# Altium footprint library Connectors_THT.PcbLib: 103 footprints (part 6 of 11)
Each footprint in its own frame and in the unit in brackets; x right, y up, seen from the top. Pads: shape width x height; smd on the part's side, far side on the other; paste and mask are expansions set on the pad; w line width, h text height; cw(c..) or ccw(c..) is an arc to the next point about the centre after c.
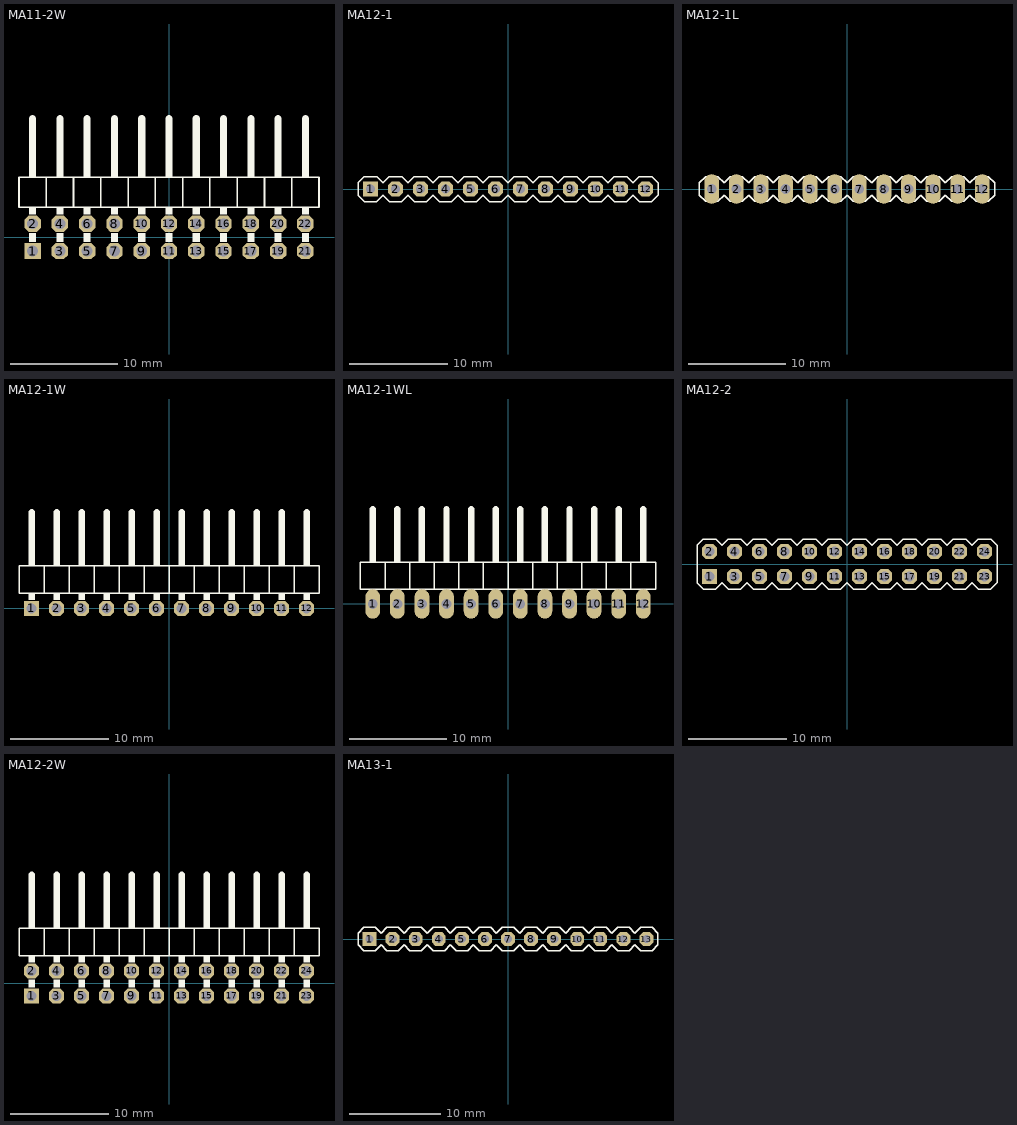
[diagram p5: the footprints below, top view; thin cyan lines are the x and y axes]

## MA11-2W [mil]
pads (22):
  rect 60x60 hole 40: 1(-500,-50)
  oct 60x60 hole 40: 2(-500,50) 3(-400,-50) 4(-400,50) 5(-300,-50) 6(-300,50) 7(-200,-50) 8(-200,50) 9(-100,-50) 10(-100,50) 11(0,-50) 12(0,50) 13(100,-50) 14(100,50) 15(200,-50) 16(200,50) 17(300,-50) 18(300,50) 19(400,-50) 20(400,50) 21(500,-50) 22(500,50)
Top Overlay:
  rectangle: 487,-16 513,16
  rectangle: 387,-16 413,16
  rectangle: 287,-16 313,16
  rectangle: 187,-16 213,16
  rectangle: 87,-16 113,16
  rectangle: -13,-16 13,16
  rectangle: -113,-16 -87,16
  rectangle: -213,-16 -187,16
  rectangle: -313,-16 -287,16
  rectangle: -413,-16 -387,16
  rectangle: -513,-16 -487,16
  rectangle: -513,84 -487,110
  rectangle: -413,84 -387,110
  rectangle: -313,84 -287,110
  rectangle: -213,84 -187,110
  rectangle: -113,84 -87,110
  rectangle: -13,84 13,110
  rectangle: 87,84 113,110
  rectangle: 187,84 213,110
  rectangle: 287,84 313,110
  rectangle: 387,84 413,110
  rectangle: 487,84 513,110
  rectangle: -113,220 -87,250
  rectangle: -213,220 -187,250
  rectangle: -313,220 -287,250
  rectangle: -413,220 -387,250
  rectangle: -513,220 -487,250
  rectangle: 387,220 413,250
  rectangle: 287,220 313,250
  rectangle: 187,220 213,250
  rectangle: 87,220 113,250
  rectangle: -13,220 13,250
  rectangle: 487,220 513,250
  lines w6: -450,110 -350,110 ; -450,110 -550,110 -550,220 -450,220 ; -450,110 -450,220 ; -450,220 -350,220 ; -350,110 -350,220 ; -350,110 -250,110 ; -350,220 -250,220 ; -250,110 -250,220 ; -250,110 -150,110 ; -250,220 -150,220 ; -150,110 -150,220 ; -150,110 -50,110 ; -150,220 -50,220 ; -50,110 -50,220 ; -50,110 50,110 ; -50,220 50,220 ; 50,110 150,110 ; 50,110 50,220 ; 50,220 150,220 ; 150,110 150,220 ; 150,110 250,110 ; 150,220 250,220 ; 250,110 250,220 ; 250,110 350,110 ; 250,220 350,220 ; 350,110 350,220 ; 350,110 450,110 ; 350,220 450,220 ; 450,110 450,220 ; 450,110 550,110 550,220 450,220
  lines w26: -500,250 -500,435 ; -400,250 -400,435 ; -300,250 -300,435 ; -200,250 -200,435 ; -100,250 -100,435 ; 0,250 0,435 ; 100,250 100,435 ; 200,250 200,435 ; 300,250 300,435 ; 400,250 400,435 ; 500,250 500,435
3D body: height 31.5, standoff 0, extent -112.49,-62.49 -87.49,-37.49
3D body: height 31.5, standoff 0, extent -112.49,37.51 -87.49,62.51
3D body: height 31.5, standoff 0, extent -212.49,-62.49 -187.49,-37.49
3D body: height 31.5, standoff 0, extent -212.49,37.51 -187.49,62.51
3D body: height 31.5, standoff 0, extent -312.49,37.51 -287.49,62.51
3D body: height 31.5, standoff 0, extent -312.49,-62.49 -287.49,-37.49
3D body: height 31.5, standoff 0, extent -412.49,-62.49 -387.49,-37.49
3D body: height 31.5, standoff 0, extent -412.49,37.51 -387.49,62.51
3D body: height 31.5, standoff 0, extent -512.5,-62.5 -487.5,-37.5
3D body: height 31.5, standoff 0, extent -512.49,37.5 -487.49,62.5
3D body: height 162.48, standoff 137.52, extent -512.5,-62.5 -487.5,443.75
3D body: height 162.48, standoff 0, extent -512.5,-62.5 -487.5,-37.5
3D body: height 62.48, standoff 0, extent -512.49,37.51 -487.49,62.51
3D body: height 200, standoff 0, extent -550,110 -450,220
3D body: height 62.5, standoff 37.5, extent -512.5,37.51 -487.5,443.75
3D body: height 62.5, standoff 37.5, extent -412.49,37.51 -387.49,443.76
3D body: height 200, standoff 0, extent -450,110 -350,220
3D body: height 62.48, standoff 0, extent -412.49,37.51 -387.49,62.51
3D body: height 162.48, standoff 0, extent -412.49,-62.49 -387.49,-37.49
3D body: height 162.48, standoff 137.52, extent -412.5,-62.49 -387.5,443.76
3D body: height 62.5, standoff 37.5, extent -312.49,37.51 -287.49,443.76
3D body: height 200, standoff 0, extent -350,110 -250,220
3D body: height 62.48, standoff 0, extent -312.49,37.51 -287.49,62.51
3D body: height 162.48, standoff 0, extent -312.49,-62.49 -287.49,-37.49
3D body: height 162.48, standoff 137.52, extent -312.5,-62.49 -287.5,443.76
3D body: height 62.5, standoff 37.5, extent -212.49,37.51 -187.49,443.76
3D body: height 200, standoff 0, extent -250,110 -150,220
3D body: height 62.48, standoff 0, extent -212.49,37.51 -187.49,62.51
3D body: height 162.48, standoff 0, extent -212.49,-62.49 -187.49,-37.49
3D body: height 162.48, standoff 137.52, extent -212.5,-62.49 -187.5,443.76
3D body: height 62.5, standoff 37.5, extent -112.49,37.51 -87.49,443.76
3D body: height 200, standoff 0, extent -150,110 -50,220
3D body: height 62.48, standoff 0, extent -112.49,37.51 -87.49,62.51
3D body: height 162.48, standoff 0, extent -112.49,-62.49 -87.49,-37.49
3D body: height 162.48, standoff 137.52, extent -112.5,-62.49 -87.5,443.76
3D body: height 31.5, standoff 0, extent 387.51,-62.49 412.51,-37.49
3D body: height 31.5, standoff 0, extent 387.51,37.51 412.51,62.51
3D body: height 31.5, standoff 0, extent 287.51,-62.49 312.51,-37.49
3D body: height 31.5, standoff 0, extent 287.51,37.51 312.51,62.51
3D body: height 31.5, standoff 0, extent 187.51,37.51 212.51,62.51
3D body: height 31.5, standoff 0, extent 187.51,-62.49 212.51,-37.49
3D body: height 31.5, standoff 0, extent 87.51,-62.49 112.51,-37.49
3D body: height 31.5, standoff 0, extent 87.51,37.51 112.51,62.51
3D body: height 31.5, standoff 0, extent -12.5,-62.5 12.5,-37.5
3D body: height 31.5, standoff 0, extent -12.49,37.5 12.51,62.5
3D body: height 162.48, standoff 137.52, extent -12.5,-62.5 12.5,443.75
3D body: height 162.48, standoff 0, extent -12.5,-62.5 12.5,-37.5
3D body: height 62.48, standoff 0, extent -12.49,37.51 12.51,62.51
3D body: height 200, standoff 0, extent -50,110 50,220
3D body: height 62.5, standoff 37.5, extent -12.5,37.51 12.5,443.75
3D body: height 62.5, standoff 37.5, extent 87.51,37.51 112.51,443.76
3D body: height 200, standoff 0, extent 50,110 150,220
3D body: height 62.48, standoff 0, extent 87.51,37.51 112.51,62.51
3D body: height 162.48, standoff 0, extent 87.51,-62.49 112.51,-37.49
3D body: height 162.48, standoff 137.52, extent 87.5,-62.49 112.5,443.76
3D body: height 62.5, standoff 37.5, extent 187.51,37.51 212.51,443.76
3D body: height 200, standoff 0, extent 150,110 250,220
3D body: height 62.48, standoff 0, extent 187.51,37.51 212.51,62.51
3D body: height 162.48, standoff 0, extent 187.51,-62.49 212.51,-37.49
3D body: height 162.48, standoff 137.52, extent 187.5,-62.49 212.5,443.76
3D body: height 62.5, standoff 37.5, extent 287.51,37.51 312.51,443.76
3D body: height 200, standoff 0, extent 250,110 350,220
3D body: height 62.48, standoff 0, extent 287.51,37.51 312.51,62.51
3D body: height 162.48, standoff 0, extent 287.51,-62.49 312.51,-37.49
3D body: height 162.48, standoff 137.52, extent 287.5,-62.49 312.5,443.76
3D body: height 62.5, standoff 37.5, extent 387.51,37.51 412.51,443.76
3D body: height 200, standoff 0, extent 350,110 450,220
3D body: height 62.48, standoff 0, extent 387.51,37.51 412.51,62.51
3D body: height 162.48, standoff 0, extent 387.51,-62.49 412.51,-37.49
3D body: height 162.48, standoff 137.52, extent 387.5,-62.49 412.5,443.76
3D body: height 31.5, standoff 0, extent 487.5,-62.5 512.5,-37.5
3D body: height 31.5, standoff 0, extent 487.51,37.5 512.51,62.5
3D body: height 162.48, standoff 137.52, extent 487.5,-62.5 512.5,443.75
3D body: height 162.48, standoff 0, extent 487.5,-62.5 512.5,-37.5
3D body: height 62.48, standoff 0, extent 487.51,37.51 512.51,62.51
3D body: height 200, standoff 0, extent 450,110 550,220
3D body: height 62.5, standoff 37.5, extent 487.5,37.51 512.5,443.75

## MA12-1 [mil]
pads (12):
  rect 60x60 hole 36: 1(-550,0)
  oct 60x60 hole 36: 2(-450,0) 3(-350,0) 4(-250,0) 5(-150,0) 6(-50,0) 7(50,0) 8(150,0) 9(250,0) 10(350,0) 11(450,0) 12(550,0)
Top Overlay:
  lines w6: -600,-25 -575,-50 -525,-50 -500,-25 -475,-50 -425,-50 -400,-25 -375,-50 -325,-50 -300,-25 -275,-50 -225,-50 -200,-25 -175,-50 -125,-50 -100,-25 -75,-50 -25,-50 0,-25 25,-50 75,-50 100,-25 125,-50 175,-50 200,-25 225,-50 275,-50 300,-25 325,-50 375,-50 400,-25 425,-50 475,-50 500,-25 525,-50 575,-50 600,-25 600,25 575,50 525,50 500,25 475,50 425,50 400,25 375,50 325,50 300,25 275,50 225,50 200,25 175,50 125,50 100,25 75,50 25,50 0,25 -25,50 -75,50 -100,25 -125,50 -175,50 -200,25 -225,50 -275,50 -300,25 -325,50 -375,50 -400,25 -425,50 -475,50 -500,25 -525,50 -575,50 -600,25 -600,-25
3D body: height 338.58, standoff 0, extent 537.5,-12.5 562.5,12.5
3D body: height 98.43, standoff 11.81, extent 500,-50 600,50
3D body: height 11.81, standoff 0, extent 500,-50 600,-25
3D body: height 11.81, standoff 0, extent 500,25 600,50
3D body: height 31.5, standoff 0, extent 537.5,-12.5 562.5,12.5
3D body: height 338.58, standoff 0, extent 437.5,-12.5 462.5,12.5
3D body: height 98.43, standoff 11.81, extent 400,-50 500,50
3D body: height 11.81, standoff 0, extent 400,-50 500,-25
3D body: height 11.81, standoff 0, extent 400,25 500,50
3D body: height 31.5, standoff 0, extent 437.5,-12.5 462.5,12.5
3D body: height 338.58, standoff 0, extent 337.5,-12.5 362.5,12.5
3D body: height 98.43, standoff 11.81, extent 300,-50 400,50
3D body: height 11.81, standoff 0, extent 300,-50 400,-25
3D body: height 11.81, standoff 0, extent 300,25 400,50
3D body: height 31.5, standoff 0, extent 337.5,-12.5 362.5,12.5
3D body: height 338.58, standoff 0, extent 237.5,-12.5 262.5,12.5
3D body: height 98.43, standoff 11.81, extent 200,-50 300,50
3D body: height 11.81, standoff 0, extent 200,-50 300,-25
3D body: height 11.81, standoff 0, extent 200,25 300,50
3D body: height 31.5, standoff 0, extent 237.5,-12.5 262.5,12.5
3D body: height 338.58, standoff 0, extent 137.5,-12.5 162.5,12.5
3D body: height 98.43, standoff 11.81, extent 100,-50 200,50
3D body: height 11.81, standoff 0, extent 100,-50 200,-25
3D body: height 11.81, standoff 0, extent 100,25 200,50
3D body: height 31.5, standoff 0, extent 137.5,-12.5 162.5,12.5
3D body: height 338.58, standoff 0, extent 37.5,-12.5 62.5,12.5
3D body: height 98.43, standoff 11.81, extent 0,-50 100,50
3D body: height 11.81, standoff 0, extent 0,-50 100,-25
3D body: height 11.81, standoff 0, extent 0,25 100,50
3D body: height 31.5, standoff 0, extent 37.5,-12.5 62.5,12.5
3D body: height 338.58, standoff 0, extent -62.5,-12.5 -37.5,12.5
3D body: height 98.43, standoff 11.81, extent -100,-50 0,50
3D body: height 11.81, standoff 0, extent -100,-50 0,-25
3D body: height 11.81, standoff 0, extent -100,25 0,50
3D body: height 31.5, standoff 0, extent -62.5,-12.5 -37.5,12.5
3D body: height 338.58, standoff 0, extent -162.5,-12.5 -137.5,12.5
3D body: height 98.43, standoff 11.81, extent -200,-50 -100,50
3D body: height 11.81, standoff 0, extent -200,-50 -100,-25
3D body: height 11.81, standoff 0, extent -200,25 -100,50
3D body: height 31.5, standoff 0, extent -162.5,-12.5 -137.5,12.5
3D body: height 338.58, standoff 0, extent -262.5,-12.5 -237.5,12.5
3D body: height 98.43, standoff 11.81, extent -300,-50 -200,50
3D body: height 11.81, standoff 0, extent -300,-50 -200,-25
3D body: height 11.81, standoff 0, extent -300,25 -200,50
3D body: height 31.5, standoff 0, extent -262.5,-12.5 -237.5,12.5
3D body: height 338.58, standoff 0, extent -362.5,-12.5 -337.5,12.5
3D body: height 98.43, standoff 11.81, extent -400,-50 -300,50
3D body: height 11.81, standoff 0, extent -400,-50 -300,-25
3D body: height 11.81, standoff 0, extent -400,25 -300,50
3D body: height 31.5, standoff 0, extent -362.5,-12.5 -337.5,12.5
3D body: height 338.58, standoff 0, extent -462.5,-12.5 -437.5,12.5
3D body: height 98.43, standoff 11.81, extent -500,-50 -400,50
3D body: height 11.81, standoff 0, extent -500,-50 -400,-25
3D body: height 11.81, standoff 0, extent -500,25 -400,50
3D body: height 31.5, standoff 0, extent -462.5,-12.5 -437.5,12.5
3D body: height 338.58, standoff 0, extent -562.5,-12.5 -537.5,12.5
3D body: height 98.43, standoff 11.81, extent -600,-50 -500,50
3D body: height 11.81, standoff 0, extent -600,-50 -500,-25
3D body: height 11.81, standoff 0, extent -600,25 -500,50
3D body: height 31.5, standoff 0, extent -562.5,-12.5 -537.5,12.5

## MA12-1L [mil]
pads (12):
  oval 60x120 hole 40: 1(-550,0) 2(-450,0) 3(-350,0) 4(-250,0) 5(-150,0) 6(-50,0) 7(50,0) 8(150,0) 9(250,0) 10(350,0) 11(450,0) 12(550,0)
Top Overlay:
  lines w6: -600,-25 -575,-50 -525,-50 -500,-25 -475,-50 -425,-50 -400,-25 -375,-50 -325,-50 -300,-25 -275,-50 -225,-50 -200,-25 -175,-50 -125,-50 -100,-25 -75,-50 -25,-50 0,-25 25,-50 75,-50 100,-25 125,-50 175,-50 200,-25 225,-50 275,-50 300,-25 325,-50 375,-50 400,-25 425,-50 475,-50 500,-25 525,-50 575,-50 600,-25 600,25 575,50 525,50 500,25 475,50 425,50 400,25 375,50 325,50 300,25 275,50 225,50 200,25 175,50 125,50 100,25 75,50 25,50 0,25 -25,50 -75,50 -100,25 -125,50 -175,50 -200,25 -225,50 -275,50 -300,25 -325,50 -375,50 -400,25 -425,50 -475,50 -500,25 -525,50 -575,50 -600,25 -600,-25
3D body: height 31.5, standoff 0, extent -562.5,-12.5 -537.5,12.5
3D body: height 11.81, standoff 0, extent -600,25 -500,50
3D body: height 11.81, standoff 0, extent -600,-50 -500,-25
3D body: height 98.43, standoff 11.81, extent -600,-50 -500,50
3D body: height 338.58, standoff 0, extent -562.49,-12.49 -537.49,12.51
3D body: height 31.5, standoff 0, extent -462.5,-12.5 -437.5,12.5
3D body: height 11.81, standoff 0, extent -500,25 -400,50
3D body: height 11.81, standoff 0, extent -500,-50 -400,-25
3D body: height 98.43, standoff 11.81, extent -500,-50 -400,50
3D body: height 338.58, standoff 0, extent -462.49,-12.49 -437.49,12.51
3D body: height 31.5, standoff 0, extent -362.5,-12.5 -337.5,12.5
3D body: height 11.81, standoff 0, extent -400,25 -300,50
3D body: height 11.81, standoff 0, extent -400,-50 -300,-25
3D body: height 98.43, standoff 11.81, extent -400,-50 -300,50
3D body: height 338.58, standoff 0, extent -362.49,-12.49 -337.49,12.51
3D body: height 31.5, standoff 0, extent -262.5,-12.5 -237.5,12.5
3D body: height 11.81, standoff 0, extent -300,25 -200,50
3D body: height 11.81, standoff 0, extent -300,-50 -200,-25
3D body: height 98.43, standoff 11.81, extent -300,-50 -200,50
3D body: height 338.58, standoff 0, extent -262.49,-12.49 -237.49,12.51
3D body: height 31.5, standoff 0, extent -162.5,-12.5 -137.5,12.5
3D body: height 11.81, standoff 0, extent -200,25 -100,50
3D body: height 11.81, standoff 0, extent -200,-50 -100,-25
3D body: height 98.43, standoff 11.81, extent -200,-50 -100,50
3D body: height 338.58, standoff 0, extent -162.49,-12.49 -137.49,12.51
3D body: height 31.5, standoff 0, extent -62.5,-12.5 -37.5,12.5
3D body: height 11.81, standoff 0, extent -100,25 0,50
3D body: height 11.81, standoff 0, extent -100,-50 0,-25
3D body: height 98.43, standoff 11.81, extent -100,-50 0,50
3D body: height 338.58, standoff 0, extent -62.49,-12.49 -37.49,12.51
3D body: height 31.5, standoff 0, extent 37.5,-12.5 62.5,12.5
3D body: height 11.81, standoff 0, extent 0,25 100,50
3D body: height 11.81, standoff 0, extent 0,-50 100,-25
3D body: height 98.43, standoff 11.81, extent 0,-50 100,50
3D body: height 338.58, standoff 0, extent 37.51,-12.49 62.51,12.51
3D body: height 31.5, standoff 0, extent 137.5,-12.5 162.5,12.5
3D body: height 11.81, standoff 0, extent 100,25 200,50
3D body: height 11.81, standoff 0, extent 100,-50 200,-25
3D body: height 98.43, standoff 11.81, extent 100,-50 200,50
3D body: height 338.58, standoff 0, extent 137.51,-12.49 162.51,12.51
3D body: height 31.5, standoff 0, extent 237.5,-12.5 262.5,12.5
3D body: height 11.81, standoff 0, extent 200,25 300,50
3D body: height 11.81, standoff 0, extent 200,-50 300,-25
3D body: height 98.43, standoff 11.81, extent 200,-50 300,50
3D body: height 338.58, standoff 0, extent 237.51,-12.49 262.51,12.51
3D body: height 31.5, standoff 0, extent 337.5,-12.5 362.5,12.5
3D body: height 11.81, standoff 0, extent 300,25 400,50
3D body: height 11.81, standoff 0, extent 300,-50 400,-25
3D body: height 98.43, standoff 11.81, extent 300,-50 400,50
3D body: height 338.58, standoff 0, extent 337.51,-12.49 362.51,12.51
3D body: height 31.5, standoff 0, extent 437.5,-12.5 462.5,12.5
3D body: height 11.81, standoff 0, extent 400,25 500,50
3D body: height 11.81, standoff 0, extent 400,-50 500,-25
3D body: height 98.43, standoff 11.81, extent 400,-50 500,50
3D body: height 338.58, standoff 0, extent 437.51,-12.49 462.51,12.51
3D body: height 31.5, standoff 0, extent 537.5,-12.5 562.5,12.5
3D body: height 11.81, standoff 0, extent 500,25 600,50
3D body: height 11.81, standoff 0, extent 500,-50 600,-25
3D body: height 98.43, standoff 11.81, extent 500,-50 600,50
3D body: height 338.58, standoff 0, extent 537.51,-12.49 562.51,12.51

## MA12-1W [mil]
pads (12):
  rect 60x60 hole 40: 1(-550,0)
  oct 60x60 hole 40: 2(-450,0) 3(-350,0) 4(-250,0) 5(-150,0) 6(-50,0) 7(50,0) 8(150,0) 9(250,0) 10(350,0) 11(450,0) 12(550,0)
Top Overlay:
  rectangle: 437,170 463,200
  rectangle: 537,170 563,200
  rectangle: -63,170 -37,200
  rectangle: 37,170 63,200
  rectangle: 137,170 163,200
  rectangle: 237,170 263,200
  rectangle: 337,170 363,200
  rectangle: -563,170 -537,200
  rectangle: -463,170 -437,200
  rectangle: -363,170 -337,200
  rectangle: -263,170 -237,200
  rectangle: -163,170 -137,200
  rectangle: 537,34 563,60
  rectangle: 437,34 463,60
  rectangle: 337,34 363,60
  rectangle: 237,34 263,60
  rectangle: 137,34 163,60
  rectangle: 37,34 63,60
  rectangle: -63,34 -37,60
  rectangle: -163,34 -137,60
  rectangle: -263,34 -237,60
  rectangle: -363,34 -337,60
  rectangle: -463,34 -437,60
  rectangle: -563,34 -537,60
  lines w6: -500,60 -500,170 ; -500,60 -600,60 -600,170 -500,170 ; -500,60 -400,60 ; -500,170 -400,170 ; -400,60 -300,60 ; -400,60 -400,170 ; -400,170 -300,170 ; -300,60 -200,60 ; -300,60 -300,170 ; -300,170 -200,170 ; -200,60 -100,60 ; -200,60 -200,170 ; -200,170 -100,170 ; -100,60 0,60 ; -100,60 -100,170 ; -100,170 0,170 ; 0,60 0,170 ; 0,60 100,60 ; 0,170 100,170 ; 100,60 200,60 ; 100,60 100,170 ; 100,170 200,170 ; 200,60 300,60 ; 200,60 200,170 ; 200,170 300,170 ; 300,60 400,60 ; 300,60 300,170 ; 300,170 400,170 ; 400,60 500,60 ; 400,60 400,170 ; 400,170 500,170 ; 500,60 500,170 ; 500,60 600,60 600,170 500,170
  lines w26: -550,200 -550,385 ; -450,200 -450,385 ; -350,200 -350,385 ; -250,200 -250,385 ; -150,200 -150,385 ; -50,200 -50,385 ; 50,200 50,385 ; 150,200 150,385 ; 250,200 250,385 ; 350,200 350,385 ; 450,200 450,385 ; 550,200 550,385
3D body: height 62.48, standoff 0, extent 537.51,-12.49 562.51,12.51
3D body: height 100, standoff 0, extent 500,60 600,170
3D body: height 62.5, standoff 37.5, extent 537.51,-12.49 562.51,393.76
3D body: height 62.5, standoff 37.5, extent 437.5,-12.49 462.5,393.75
3D body: height 100, standoff 0, extent 400,60 500,170
3D body: height 62.48, standoff 0, extent 437.51,-12.49 462.51,12.51
3D body: height 31.5, standoff 0, extent 437.51,-12.49 462.51,12.51
3D body: height 31.5, standoff 0, extent 537.51,-12.49 562.51,12.51
3D body: height 62.48, standoff 0, extent 337.51,-12.49 362.51,12.51
3D body: height 100, standoff 0, extent 300,60 400,170
3D body: height 62.5, standoff 37.5, extent 337.51,-12.49 362.51,393.76
3D body: height 62.48, standoff 0, extent 237.51,-12.49 262.51,12.51
3D body: height 100, standoff 0, extent 200,60 300,170
3D body: height 62.5, standoff 37.5, extent 237.51,-12.49 262.51,393.76
3D body: height 62.48, standoff 0, extent 137.51,-12.49 162.51,12.51
3D body: height 100, standoff 0, extent 100,60 200,170
3D body: height 62.5, standoff 37.5, extent 137.51,-12.49 162.51,393.76
3D body: height 62.48, standoff 0, extent 37.51,-12.49 62.51,12.51
3D body: height 100, standoff 0, extent 0,60 100,170
3D body: height 62.5, standoff 37.5, extent 37.51,-12.49 62.51,393.76
3D body: height 62.5, standoff 37.5, extent -62.5,-12.49 -37.5,393.75
3D body: height 100, standoff 0, extent -100,60 0,170
3D body: height 62.48, standoff 0, extent -62.49,-12.49 -37.49,12.51
3D body: height 31.5, standoff 0, extent -62.49,-12.49 -37.49,12.51
3D body: height 31.5, standoff 0, extent 37.51,-12.49 62.51,12.51
3D body: height 31.5, standoff 0, extent 137.51,-12.49 162.51,12.51
3D body: height 31.5, standoff 0, extent 237.51,-12.49 262.51,12.51
3D body: height 31.5, standoff 0, extent 337.51,-12.49 362.51,12.51
3D body: height 62.48, standoff 0, extent -162.49,-12.49 -137.49,12.51
3D body: height 100, standoff 0, extent -200,60 -100,170
3D body: height 62.5, standoff 37.5, extent -162.49,-12.49 -137.49,393.76
3D body: height 62.48, standoff 0, extent -262.49,-12.49 -237.49,12.51
3D body: height 100, standoff 0, extent -300,60 -200,170
3D body: height 62.5, standoff 37.5, extent -262.49,-12.49 -237.49,393.76
3D body: height 62.48, standoff 0, extent -362.49,-12.49 -337.49,12.51
3D body: height 100, standoff 0, extent -400,60 -300,170
3D body: height 62.5, standoff 37.5, extent -362.49,-12.49 -337.49,393.76
3D body: height 62.48, standoff 0, extent -462.49,-12.49 -437.49,12.51
3D body: height 100, standoff 0, extent -500,60 -400,170
3D body: height 62.5, standoff 37.5, extent -462.49,-12.49 -437.49,393.76
3D body: height 62.5, standoff 37.5, extent -562.5,-12.49 -537.5,393.75
3D body: height 100, standoff 0, extent -600,60 -500,170
3D body: height 62.48, standoff 0, extent -562.49,-12.49 -537.49,12.51
3D body: height 31.5, standoff 0, extent -562.49,-12.49 -537.49,12.51
3D body: height 31.5, standoff 0, extent -462.49,-12.49 -437.49,12.51
3D body: height 31.5, standoff 0, extent -362.49,-12.49 -337.49,12.51
3D body: height 31.5, standoff 0, extent -262.49,-12.49 -237.49,12.51
3D body: height 31.5, standoff 0, extent -162.49,-12.49 -137.49,12.51

## MA12-1WL [mil]
pads (12):
  oval 60x120 hole 40: 1(-550,0) 2(-450,0) 3(-350,0) 4(-250,0) 5(-150,0) 6(-50,0) 7(50,0) 8(150,0) 9(250,0) 10(350,0) 11(450,0) 12(550,0)
Top Overlay:
  rectangle: 437,170 463,200
  rectangle: 537,170 563,200
  rectangle: -63,170 -37,200
  rectangle: 37,170 63,200
  rectangle: 137,170 163,200
  rectangle: 237,170 263,200
  rectangle: 337,170 363,200
  rectangle: -563,170 -537,200
  rectangle: -463,170 -437,200
  rectangle: -363,170 -337,200
  rectangle: -263,170 -237,200
  rectangle: -163,170 -137,200
  rectangle: 537,34 563,60
  rectangle: 437,34 463,60
  rectangle: 337,34 363,60
  rectangle: 237,34 263,60
  rectangle: 137,34 163,60
  rectangle: 37,34 63,60
  rectangle: -63,34 -37,60
  rectangle: -163,34 -137,60
  rectangle: -263,34 -237,60
  rectangle: -363,34 -337,60
  rectangle: -463,34 -437,60
  rectangle: -563,34 -537,60
  lines w6: -500,60 -500,170 ; -500,60 -600,60 -600,170 -500,170 ; -500,60 -400,60 ; -500,170 -400,170 ; -400,60 -300,60 ; -400,60 -400,170 ; -400,170 -300,170 ; -300,60 -200,60 ; -300,60 -300,170 ; -300,170 -200,170 ; -200,60 -100,60 ; -200,60 -200,170 ; -200,170 -100,170 ; -100,60 0,60 ; -100,60 -100,170 ; -100,170 0,170 ; 0,60 0,170 ; 0,60 100,60 ; 0,170 100,170 ; 100,60 200,60 ; 100,60 100,170 ; 100,170 200,170 ; 200,60 300,60 ; 200,60 200,170 ; 200,170 300,170 ; 300,60 400,60 ; 300,60 300,170 ; 300,170 400,170 ; 400,60 500,60 ; 400,60 400,170 ; 400,170 500,170 ; 500,60 500,170 ; 500,60 600,60 600,170 500,170
  lines w26: -550,200 -550,385 ; -450,200 -450,385 ; -350,200 -350,385 ; -250,200 -250,385 ; -150,200 -150,385 ; -50,200 -50,385 ; 50,200 50,385 ; 150,200 150,385 ; 250,200 250,385 ; 350,200 350,385 ; 450,200 450,385 ; 550,200 550,385
3D body: height 62.48, standoff 0, extent 537.51,-12.49 562.51,12.51
3D body: height 100, standoff 0, extent 500,60 600,170
3D body: height 62.5, standoff 37.5, extent 537.51,-12.49 562.51,393.76
3D body: height 62.5, standoff 37.5, extent 437.5,-12.49 462.5,393.75
3D body: height 100, standoff 0, extent 400,60 500,170
3D body: height 62.48, standoff 0, extent 437.51,-12.49 462.51,12.51
3D body: height 31.5, standoff 0, extent 437.51,-12.49 462.51,12.51
3D body: height 31.5, standoff 0, extent 537.51,-12.49 562.51,12.51
3D body: height 62.48, standoff 0, extent 337.51,-12.49 362.51,12.51
3D body: height 100, standoff 0, extent 300,60 400,170
3D body: height 62.5, standoff 37.5, extent 337.51,-12.49 362.51,393.76
3D body: height 62.48, standoff 0, extent 237.51,-12.49 262.51,12.51
3D body: height 100, standoff 0, extent 200,60 300,170
3D body: height 62.5, standoff 37.5, extent 237.51,-12.49 262.51,393.76
3D body: height 62.48, standoff 0, extent 137.51,-12.49 162.51,12.51
3D body: height 100, standoff 0, extent 100,60 200,170
3D body: height 62.5, standoff 37.5, extent 137.51,-12.49 162.51,393.76
3D body: height 62.48, standoff 0, extent 37.51,-12.49 62.51,12.51
3D body: height 100, standoff 0, extent 0,60 100,170
3D body: height 62.5, standoff 37.5, extent 37.51,-12.49 62.51,393.76
3D body: height 62.5, standoff 37.5, extent -62.5,-12.49 -37.5,393.75
3D body: height 100, standoff 0, extent -100,60 0,170
3D body: height 62.48, standoff 0, extent -62.49,-12.49 -37.49,12.51
3D body: height 31.5, standoff 0, extent -62.49,-12.49 -37.49,12.51
3D body: height 31.5, standoff 0, extent 37.51,-12.49 62.51,12.51
3D body: height 31.5, standoff 0, extent 137.51,-12.49 162.51,12.51
3D body: height 31.5, standoff 0, extent 237.51,-12.49 262.51,12.51
3D body: height 31.5, standoff 0, extent 337.51,-12.49 362.51,12.51
3D body: height 62.48, standoff 0, extent -162.49,-12.49 -137.49,12.51
3D body: height 100, standoff 0, extent -200,60 -100,170
3D body: height 62.5, standoff 37.5, extent -162.49,-12.49 -137.49,393.76
3D body: height 62.48, standoff 0, extent -262.49,-12.49 -237.49,12.51
3D body: height 100, standoff 0, extent -300,60 -200,170
3D body: height 62.5, standoff 37.5, extent -262.49,-12.49 -237.49,393.76
3D body: height 62.48, standoff 0, extent -362.49,-12.49 -337.49,12.51
3D body: height 100, standoff 0, extent -400,60 -300,170
3D body: height 62.5, standoff 37.5, extent -362.49,-12.49 -337.49,393.76
3D body: height 62.48, standoff 0, extent -462.49,-12.49 -437.49,12.51
3D body: height 100, standoff 0, extent -500,60 -400,170
3D body: height 62.5, standoff 37.5, extent -462.49,-12.49 -437.49,393.76
3D body: height 62.5, standoff 37.5, extent -562.5,-12.49 -537.5,393.75
3D body: height 100, standoff 0, extent -600,60 -500,170
3D body: height 62.48, standoff 0, extent -562.49,-12.49 -537.49,12.51
3D body: height 31.5, standoff 0, extent -562.49,-12.49 -537.49,12.51
3D body: height 31.5, standoff 0, extent -462.49,-12.49 -437.49,12.51
3D body: height 31.5, standoff 0, extent -362.49,-12.49 -337.49,12.51
3D body: height 31.5, standoff 0, extent -262.49,-12.49 -237.49,12.51
3D body: height 31.5, standoff 0, extent -162.49,-12.49 -137.49,12.51

## MA12-2 [mil]
pads (24):
  rect 60x60 hole 40: 1(-550,-50)
  oct 60x60 hole 40: 2(-550,50) 3(-450,-50) 4(-450,50) 5(-350,-50) 6(-350,50) 7(-250,-50) 8(-250,50) 9(-150,-50) 10(-150,50) 11(-50,-50) 12(-50,50) 13(50,-50) 14(50,50) 15(150,-50) 16(150,50) 17(250,-50) 18(250,50) 19(350,-50) 20(350,50) 21(450,-50) 22(450,50) 23(550,-50) 24(550,50)
Top Overlay:
  lines w6: -600,-75 -575,-100 -525,-100 -500,-75 -475,-100 -425,-100 -400,-75 -375,-100 -325,-100 -300,-75 -275,-100 -225,-100 -200,-75 -175,-100 -125,-100 -100,-75 -75,-100 -25,-100 0,-75 25,-100 75,-100 100,-75 125,-100 175,-100 200,-75 225,-100 275,-100 300,-75 325,-100 375,-100 400,-75 425,-100 475,-100 500,-75 525,-100 575,-100 600,-75 600,75 575,100 525,100 500,75 475,100 425,100 400,75 375,100 325,100 300,75 275,100 225,100 200,75 175,100 125,100 100,75 75,100 25,100 0,75 -25,100 -75,100 -100,75 -125,100 -175,100 -200,75 -225,100 -275,100 -300,75 -325,100 -375,100 -400,75 -425,100 -475,100 -500,75 -525,100 -575,100 -600,75 -600,-75
3D body: height 31.5, standoff 0, extent 137.51,-62.49 162.51,-37.49
3D body: height 338.58, standoff 0, extent 137.51,37.51 162.51,62.51
3D body: height 98.43, standoff 11.81, extent 100,-100 200,100
3D body: height 11.81, standoff 0, extent 100,75 200,100
3D body: height 11.81, standoff 0, extent 100,-100 200,-75
3D body: height 338.58, standoff 0, extent 137.51,-62.49 162.51,-37.49
3D body: height 31.5, standoff 0, extent 137.51,37.51 162.51,62.51
3D body: height 31.5, standoff 0, extent 237.51,-62.49 262.51,-37.49
3D body: height 338.58, standoff 0, extent 237.51,37.51 262.51,62.51
3D body: height 98.43, standoff 11.81, extent 200,-100 300,100
3D body: height 11.81, standoff 0, extent 200,75 300,100
3D body: height 11.81, standoff 0, extent 200,-100 300,-75
3D body: height 338.58, standoff 0, extent 237.51,-62.49 262.51,-37.49
3D body: height 31.5, standoff 0, extent 237.51,37.51 262.51,62.51
3D body: height 31.5, standoff 0, extent 337.51,-62.49 362.51,-37.49
3D body: height 338.58, standoff 0, extent 337.51,37.51 362.51,62.51
3D body: height 98.43, standoff 11.81, extent 300,-100 400,100
3D body: height 11.81, standoff 0, extent 300,75 400,100
3D body: height 11.81, standoff 0, extent 300,-100 400,-75
3D body: height 338.58, standoff 0, extent 337.51,-62.49 362.51,-37.49
3D body: height 31.5, standoff 0, extent 337.51,37.51 362.51,62.51
3D body: height 31.5, standoff 0, extent 437.51,-62.49 462.51,-37.49
3D body: height 338.58, standoff 0, extent 437.51,37.51 462.51,62.51
3D body: height 98.43, standoff 11.81, extent 400,-100 500,100
3D body: height 11.81, standoff 0, extent 400,75 500,100
3D body: height 11.81, standoff 0, extent 400,-100 500,-75
3D body: height 338.58, standoff 0, extent 437.51,-62.49 462.51,-37.49
3D body: height 31.5, standoff 0, extent 437.51,37.51 462.51,62.51
3D body: height 31.5, standoff 0, extent 537.51,-62.49 562.51,-37.49
3D body: height 338.58, standoff 0, extent 537.51,37.51 562.51,62.51
3D body: height 98.43, standoff 11.81, extent 500,-100 600,100
3D body: height 11.81, standoff 0, extent 500,75 600,100
3D body: height 11.81, standoff 0, extent 500,-100 600,-75
3D body: height 338.58, standoff 0, extent 537.51,-62.49 562.51,-37.49
3D body: height 31.5, standoff 0, extent 537.51,37.51 562.51,62.51
3D body: height 31.5, standoff 0, extent 37.51,37.51 62.51,62.51
3D body: height 338.58, standoff 0, extent 37.51,-62.49 62.51,-37.49
3D body: height 11.81, standoff 0, extent 0,-100 100,-75
3D body: height 11.81, standoff 0, extent 0,75 100,100
3D body: height 98.43, standoff 11.81, extent 0,-100 100,100
3D body: height 338.58, standoff 0, extent 37.51,37.51 62.51,62.51
3D body: height 31.5, standoff 0, extent 37.51,-62.49 62.51,-37.49
3D body: height 31.5, standoff 0, extent -62.49,37.51 -37.49,62.51
3D body: height 338.58, standoff 0, extent -62.49,-62.49 -37.49,-37.49
3D body: height 11.81, standoff 0, extent -100,-100 0,-75
3D body: height 11.81, standoff 0, extent -100,75 0,100
3D body: height 98.43, standoff 11.81, extent -100,-100 0,100
3D body: height 338.58, standoff 0, extent -62.49,37.51 -37.49,62.51
3D body: height 31.5, standoff 0, extent -62.49,-62.49 -37.49,-37.49
3D body: height 31.5, standoff 0, extent -162.49,37.51 -137.49,62.51
3D body: height 338.58, standoff 0, extent -162.49,-62.49 -137.49,-37.49
3D body: height 11.81, standoff 0, extent -200,-100 -100,-75
3D body: height 11.81, standoff 0, extent -200,75 -100,100
3D body: height 98.43, standoff 11.81, extent -200,-100 -100,100
3D body: height 338.58, standoff 0, extent -162.49,37.51 -137.49,62.51
3D body: height 31.5, standoff 0, extent -162.49,-62.49 -137.49,-37.49
3D body: height 31.5, standoff 0, extent -262.49,37.51 -237.49,62.51
3D body: height 338.58, standoff 0, extent -262.49,-62.49 -237.49,-37.49
3D body: height 11.81, standoff 0, extent -300,-100 -200,-75
3D body: height 11.81, standoff 0, extent -300,75 -200,100
3D body: height 98.43, standoff 11.81, extent -300,-100 -200,100
3D body: height 338.58, standoff 0, extent -262.49,37.51 -237.49,62.51
3D body: height 31.5, standoff 0, extent -262.49,-62.49 -237.49,-37.49
3D body: height 31.5, standoff 0, extent -362.49,37.51 -337.49,62.51
3D body: height 338.58, standoff 0, extent -362.49,-62.49 -337.49,-37.49
3D body: height 11.81, standoff 0, extent -400,-100 -300,-75
3D body: height 11.81, standoff 0, extent -400,75 -300,100
3D body: height 98.43, standoff 11.81, extent -400,-100 -300,100
3D body: height 338.58, standoff 0, extent -362.49,37.51 -337.49,62.51
3D body: height 31.5, standoff 0, extent -362.49,-62.49 -337.49,-37.49
3D body: height 31.5, standoff 0, extent -462.49,37.51 -437.49,62.51
3D body: height 338.58, standoff 0, extent -462.49,-62.49 -437.49,-37.49
3D body: height 11.81, standoff 0, extent -500,-100 -400,-75
3D body: height 11.81, standoff 0, extent -500,75 -400,100
3D body: height 98.43, standoff 11.81, extent -500,-100 -400,100
3D body: height 338.58, standoff 0, extent -462.49,37.51 -437.49,62.51
3D body: height 31.5, standoff 0, extent -462.49,-62.49 -437.49,-37.49
3D body: height 31.5, standoff 0, extent -562.49,37.51 -537.49,62.51
3D body: height 338.58, standoff 0, extent -562.49,-62.49 -537.49,-37.49
3D body: height 11.81, standoff 0, extent -600,-100 -500,-75
3D body: height 11.81, standoff 0, extent -600,75 -500,100
3D body: height 98.43, standoff 11.81, extent -600,-100 -500,100
3D body: height 338.58, standoff 0, extent -562.49,37.51 -537.49,62.51
3D body: height 31.5, standoff 0, extent -562.49,-62.49 -537.49,-37.49

## MA12-2W [mil]
pads (24):
  rect 60x60 hole 40: 1(-550,-50)
  oct 60x60 hole 40: 2(-550,50) 3(-450,-50) 4(-450,50) 5(-350,-50) 6(-350,50) 7(-250,-50) 8(-250,50) 9(-150,-50) 10(-150,50) 11(-50,-50) 12(-50,50) 13(50,-50) 14(50,50) 15(150,-50) 16(150,50) 17(250,-50) 18(250,50) 19(350,-50) 20(350,50) 21(450,-50) 22(450,50) 23(550,-50) 24(550,50)
Top Overlay:
  rectangle: 537,-16 563,16
  rectangle: 437,-16 463,16
  rectangle: 337,-16 363,16
  rectangle: 237,-16 263,16
  rectangle: 137,-16 163,16
  rectangle: 37,-16 63,16
  rectangle: -63,-16 -37,16
  rectangle: -163,-16 -137,16
  rectangle: -263,-16 -237,16
  rectangle: -363,-16 -337,16
  rectangle: -463,-16 -437,16
  rectangle: -563,-16 -537,16
  rectangle: -563,84 -537,110
  rectangle: -463,84 -437,110
  rectangle: -363,84 -337,110
  rectangle: -263,84 -237,110
  rectangle: -163,84 -137,110
  rectangle: -63,84 -37,110
  rectangle: 37,84 63,110
  rectangle: 137,84 163,110
  rectangle: 237,84 263,110
  rectangle: 337,84 363,110
  rectangle: 437,84 463,110
  rectangle: 537,84 563,110
  rectangle: -163,220 -137,250
  rectangle: -263,220 -237,250
  rectangle: -363,220 -337,250
  rectangle: -463,220 -437,250
  rectangle: -563,220 -537,250
  rectangle: 337,220 363,250
  rectangle: 237,220 263,250
  rectangle: 137,220 163,250
  rectangle: 37,220 63,250
  rectangle: -63,220 -37,250
  rectangle: 537,220 563,250
  rectangle: 437,220 463,250
  lines w6: -500,110 -400,110 ; -500,110 -600,110 -600,220 -500,220 ; -500,110 -500,220 ; -500,220 -400,220 ; -400,110 -400,220 ; -400,110 -300,110 ; -400,220 -300,220 ; -300,110 -300,220 ; -300,110 -200,110 ; -300,220 -200,220 ; -200,110 -200,220 ; -200,110 -100,110 ; -200,220 -100,220 ; -100,110 -100,220 ; -100,110 0,110 ; -100,220 0,220 ; 0,110 100,110 ; 0,110 0,220 ; 0,220 100,220 ; 100,110 100,220 ; 100,110 200,110 ; 100,220 200,220 ; 200,110 200,220 ; 200,110 300,110 ; 200,220 300,220 ; 300,110 300,220 ; 300,110 400,110 ; 300,220 400,220 ; 400,110 400,220 ; 400,110 500,110 ; 400,220 500,220 ; 500,110 600,110 600,220 500,220 ; 500,110 500,220
  lines w26: -550,250 -550,435 ; -450,250 -450,435 ; -350,250 -350,435 ; -250,250 -250,435 ; -150,250 -150,435 ; -50,250 -50,435 ; 50,250 50,435 ; 150,250 150,435 ; 250,250 250,435 ; 350,250 350,435 ; 450,250 450,435 ; 550,250 550,435
3D body: height 31.5, standoff 0, extent -162.49,-62.49 -137.49,-37.49
3D body: height 31.5, standoff 0, extent -162.49,37.51 -137.49,62.51
3D body: height 31.5, standoff 0, extent -262.49,-62.49 -237.49,-37.49
3D body: height 31.5, standoff 0, extent -262.49,37.51 -237.49,62.51
3D body: height 31.5, standoff 0, extent -362.49,37.51 -337.49,62.51
3D body: height 31.5, standoff 0, extent -362.49,-62.49 -337.49,-37.49
3D body: height 31.5, standoff 0, extent -462.49,-62.49 -437.49,-37.49
3D body: height 31.5, standoff 0, extent -462.49,37.51 -437.49,62.51
3D body: height 31.5, standoff 0, extent -562.5,-62.5 -537.5,-37.5
3D body: height 31.5, standoff 0, extent -562.49,37.5 -537.49,62.5
3D body: height 162.48, standoff 137.52, extent -562.5,-62.5 -537.5,443.75
3D body: height 162.48, standoff 0, extent -562.5,-62.5 -537.5,-37.5
3D body: height 62.48, standoff 0, extent -562.49,37.51 -537.49,62.51
3D body: height 200, standoff 0, extent -600,110 -500,220
3D body: height 62.5, standoff 37.5, extent -562.5,37.51 -537.5,443.75
3D body: height 62.5, standoff 37.5, extent -462.49,37.51 -437.49,443.76
3D body: height 200, standoff 0, extent -500,110 -400,220
3D body: height 62.48, standoff 0, extent -462.49,37.51 -437.49,62.51
3D body: height 162.48, standoff 0, extent -462.49,-62.49 -437.49,-37.49
3D body: height 162.48, standoff 137.52, extent -462.5,-62.49 -437.5,443.76
3D body: height 62.5, standoff 37.5, extent -362.49,37.51 -337.49,443.76
3D body: height 200, standoff 0, extent -400,110 -300,220
3D body: height 62.48, standoff 0, extent -362.49,37.51 -337.49,62.51
3D body: height 162.48, standoff 0, extent -362.49,-62.49 -337.49,-37.49
3D body: height 162.48, standoff 137.52, extent -362.5,-62.49 -337.5,443.76
3D body: height 62.5, standoff 37.5, extent -262.49,37.51 -237.49,443.76
3D body: height 200, standoff 0, extent -300,110 -200,220
3D body: height 62.48, standoff 0, extent -262.49,37.51 -237.49,62.51
3D body: height 162.48, standoff 0, extent -262.49,-62.49 -237.49,-37.49
3D body: height 162.48, standoff 137.52, extent -262.5,-62.49 -237.5,443.76
3D body: height 62.5, standoff 37.5, extent -162.49,37.51 -137.49,443.76
3D body: height 200, standoff 0, extent -200,110 -100,220
3D body: height 62.48, standoff 0, extent -162.49,37.51 -137.49,62.51
3D body: height 162.48, standoff 0, extent -162.49,-62.49 -137.49,-37.49
3D body: height 162.48, standoff 137.52, extent -162.5,-62.49 -137.5,443.76
3D body: height 31.5, standoff 0, extent 337.51,-62.49 362.51,-37.49
3D body: height 31.5, standoff 0, extent 337.51,37.51 362.51,62.51
3D body: height 31.5, standoff 0, extent 237.51,-62.49 262.51,-37.49
3D body: height 31.5, standoff 0, extent 237.51,37.51 262.51,62.51
3D body: height 31.5, standoff 0, extent 137.51,37.51 162.51,62.51
3D body: height 31.5, standoff 0, extent 137.51,-62.49 162.51,-37.49
3D body: height 31.5, standoff 0, extent 37.51,-62.49 62.51,-37.49
3D body: height 31.5, standoff 0, extent 37.51,37.51 62.51,62.51
3D body: height 31.5, standoff 0, extent -62.5,-62.5 -37.5,-37.5
3D body: height 31.5, standoff 0, extent -62.49,37.5 -37.49,62.5
3D body: height 162.48, standoff 137.52, extent -62.5,-62.5 -37.5,443.75
3D body: height 162.48, standoff 0, extent -62.5,-62.5 -37.5,-37.5
3D body: height 62.48, standoff 0, extent -62.49,37.51 -37.49,62.51
3D body: height 200, standoff 0, extent -100,110 0,220
3D body: height 62.5, standoff 37.5, extent -62.5,37.51 -37.5,443.75
3D body: height 62.5, standoff 37.5, extent 37.51,37.51 62.51,443.76
3D body: height 200, standoff 0, extent 0,110 100,220
3D body: height 62.48, standoff 0, extent 37.51,37.51 62.51,62.51
3D body: height 162.48, standoff 0, extent 37.51,-62.49 62.51,-37.49
3D body: height 162.48, standoff 137.52, extent 37.5,-62.49 62.5,443.76
3D body: height 62.5, standoff 37.5, extent 137.51,37.51 162.51,443.76
3D body: height 200, standoff 0, extent 100,110 200,220
3D body: height 62.48, standoff 0, extent 137.51,37.51 162.51,62.51
3D body: height 162.48, standoff 0, extent 137.51,-62.49 162.51,-37.49
3D body: height 162.48, standoff 137.52, extent 137.5,-62.49 162.5,443.76
3D body: height 62.5, standoff 37.5, extent 237.51,37.51 262.51,443.76
3D body: height 200, standoff 0, extent 200,110 300,220
3D body: height 62.48, standoff 0, extent 237.51,37.51 262.51,62.51
3D body: height 162.48, standoff 0, extent 237.51,-62.49 262.51,-37.49
3D body: height 162.48, standoff 137.52, extent 237.5,-62.49 262.5,443.76
3D body: height 62.5, standoff 37.5, extent 337.51,37.51 362.51,443.76
3D body: height 200, standoff 0, extent 300,110 400,220
3D body: height 62.48, standoff 0, extent 337.51,37.51 362.51,62.51
3D body: height 162.48, standoff 0, extent 337.51,-62.49 362.51,-37.49
3D body: height 162.48, standoff 137.52, extent 337.5,-62.49 362.5,443.76
3D body: height 31.5, standoff 0, extent 537.51,-62.49 562.51,-37.49
3D body: height 31.5, standoff 0, extent 537.51,37.51 562.51,62.51
3D body: height 31.5, standoff 0, extent 437.5,-62.5 462.5,-37.5
3D body: height 31.5, standoff 0, extent 437.51,37.5 462.51,62.5
3D body: height 162.48, standoff 137.52, extent 437.5,-62.5 462.5,443.75
3D body: height 162.48, standoff 0, extent 437.5,-62.5 462.5,-37.5
3D body: height 62.48, standoff 0, extent 437.51,37.51 462.51,62.51
3D body: height 200, standoff 0, extent 400,110 500,220
3D body: height 62.5, standoff 37.5, extent 437.5,37.51 462.5,443.75
3D body: height 62.5, standoff 37.5, extent 537.51,37.51 562.51,443.76
3D body: height 200, standoff 0, extent 500,110 600,220
3D body: height 62.48, standoff 0, extent 537.51,37.51 562.51,62.51
3D body: height 162.48, standoff 0, extent 537.51,-62.49 562.51,-37.49
3D body: height 162.48, standoff 137.52, extent 537.5,-62.49 562.5,443.76

## MA13-1 [mil]
pads (13):
  rect 60x60 hole 36: 1(-600,0)
  oct 60x60 hole 36: 2(-500,0) 3(-400,0) 4(-300,0) 5(-200,0) 6(-100,0) 7(0,0) 8(100,0) 9(200,0) 10(300,0) 11(400,0) 12(500,0) 13(600,0)
Top Overlay:
  lines w6: -650,-25 -625,-50 -575,-50 -550,-25 -525,-50 -475,-50 -450,-25 -425,-50 -375,-50 -350,-25 -325,-50 -275,-50 -250,-25 -225,-50 -175,-50 -150,-25 -125,-50 -75,-50 -50,-25 -25,-50 25,-50 50,-25 75,-50 125,-50 150,-25 175,-50 225,-50 250,-25 275,-50 325,-50 350,-25 375,-50 425,-50 450,-25 475,-50 525,-50 550,-25 575,-50 625,-50 650,-25 650,25 625,50 575,50 550,25 525,50 475,50 450,25 425,50 375,50 350,25 325,50 275,50 250,25 225,50 175,50 150,25 125,50 75,50 50,25 25,50 -25,50 -50,25 -75,50 -125,50 -150,25 -175,50 -225,50 -250,25 -275,50 -325,50 -350,25 -375,50 -425,50 -450,25 -475,50 -525,50 -550,25 -575,50 -625,50 -650,25 -650,-25
3D body: height 31.5, standoff 0, extent 587.5,-12.5 612.5,12.5
3D body: height 11.81, standoff 0, extent 550,25 650,50
3D body: height 11.81, standoff 0, extent 550,-50 650,-25
3D body: height 98.43, standoff 11.81, extent 550,-50 650,50
3D body: height 338.58, standoff 0, extent 587.5,-12.5 612.5,12.5
3D body: height 338.58, standoff 0, extent 487.5,-12.5 512.5,12.5
3D body: height 98.43, standoff 11.81, extent 450,-50 550,50
3D body: height 11.81, standoff 0, extent 450,-50 550,-25
3D body: height 11.81, standoff 0, extent 450,25 550,50
3D body: height 31.5, standoff 0, extent 487.5,-12.5 512.5,12.5
3D body: height 338.58, standoff 0, extent 387.5,-12.5 412.5,12.5
3D body: height 98.43, standoff 11.81, extent 350,-50 450,50
3D body: height 11.81, standoff 0, extent 350,-50 450,-25
3D body: height 11.81, standoff 0, extent 350,25 450,50
3D body: height 31.5, standoff 0, extent 387.5,-12.5 412.5,12.5
3D body: height 338.58, standoff 0, extent 287.5,-12.5 312.5,12.5
3D body: height 98.43, standoff 11.81, extent 250,-50 350,50
3D body: height 11.81, standoff 0, extent 250,-50 350,-25
3D body: height 11.81, standoff 0, extent 250,25 350,50
3D body: height 31.5, standoff 0, extent 287.5,-12.5 312.5,12.5
3D body: height 338.58, standoff 0, extent 187.5,-12.5 212.5,12.5
3D body: height 98.43, standoff 11.81, extent 150,-50 250,50
3D body: height 11.81, standoff 0, extent 150,-50 250,-25
3D body: height 11.81, standoff 0, extent 150,25 250,50
3D body: height 31.5, standoff 0, extent 187.5,-12.5 212.5,12.5
3D body: height 338.58, standoff 0, extent 87.5,-12.5 112.5,12.5
3D body: height 98.43, standoff 11.81, extent 50,-50 150,50
3D body: height 11.81, standoff 0, extent 50,-50 150,-25
3D body: height 11.81, standoff 0, extent 50,25 150,50
3D body: height 31.5, standoff 0, extent 87.5,-12.5 112.5,12.5
3D body: height 338.58, standoff 0, extent -12.5,-12.5 12.5,12.5
3D body: height 98.43, standoff 11.81, extent -50,-50 50,50
3D body: height 11.81, standoff 0, extent -50,-50 50,-25
3D body: height 11.81, standoff 0, extent -50,25 50,50
3D body: height 31.5, standoff 0, extent -12.5,-12.5 12.5,12.5
3D body: height 338.58, standoff 0, extent -112.5,-12.5 -87.5,12.5
3D body: height 98.43, standoff 11.81, extent -150,-50 -50,50
3D body: height 11.81, standoff 0, extent -150,-50 -50,-25
3D body: height 11.81, standoff 0, extent -150,25 -50,50
3D body: height 31.5, standoff 0, extent -112.5,-12.5 -87.5,12.5
3D body: height 338.58, standoff 0, extent -212.5,-12.5 -187.5,12.5
3D body: height 98.43, standoff 11.81, extent -250,-50 -150,50
3D body: height 11.81, standoff 0, extent -250,-50 -150,-25
3D body: height 11.81, standoff 0, extent -250,25 -150,50
3D body: height 31.5, standoff 0, extent -212.5,-12.5 -187.5,12.5
3D body: height 338.58, standoff 0, extent -312.5,-12.5 -287.5,12.5
3D body: height 98.43, standoff 11.81, extent -350,-50 -250,50
3D body: height 11.81, standoff 0, extent -350,-50 -250,-25
3D body: height 11.81, standoff 0, extent -350,25 -250,50
3D body: height 31.5, standoff 0, extent -312.5,-12.5 -287.5,12.5
3D body: height 338.58, standoff 0, extent -412.5,-12.5 -387.5,12.5
3D body: height 98.43, standoff 11.81, extent -450,-50 -350,50
3D body: height 11.81, standoff 0, extent -450,-50 -350,-25
3D body: height 11.81, standoff 0, extent -450,25 -350,50
3D body: height 31.5, standoff 0, extent -412.5,-12.5 -387.5,12.5
3D body: height 338.58, standoff 0, extent -512.5,-12.5 -487.5,12.5
3D body: height 98.43, standoff 11.81, extent -550,-50 -450,50
3D body: height 11.81, standoff 0, extent -550,-50 -450,-25
3D body: height 11.81, standoff 0, extent -550,25 -450,50
3D body: height 31.5, standoff 0, extent -512.5,-12.5 -487.5,12.5
3D body: height 338.58, standoff 0, extent -612.5,-12.5 -587.5,12.5
3D body: height 98.43, standoff 11.81, extent -650,-50 -550,50
3D body: height 11.81, standoff 0, extent -650,-50 -550,-25
3D body: height 11.81, standoff 0, extent -650,25 -550,50
3D body: height 31.5, standoff 0, extent -612.5,-12.5 -587.5,12.5